# Altium footprint library 2020-09-26_17-27-19.PcbLib: 69 footprints (part 1 of 5)
Each footprint in its own frame and in the unit in brackets; x right, y up, seen from the top. Pads: shape width x height; smd on the part's side, far side on the other; paste and mask are expansions set on the pad; w line width, h text height; cw(c..) or ccw(c..) is an arc to the next point about the centre after c.
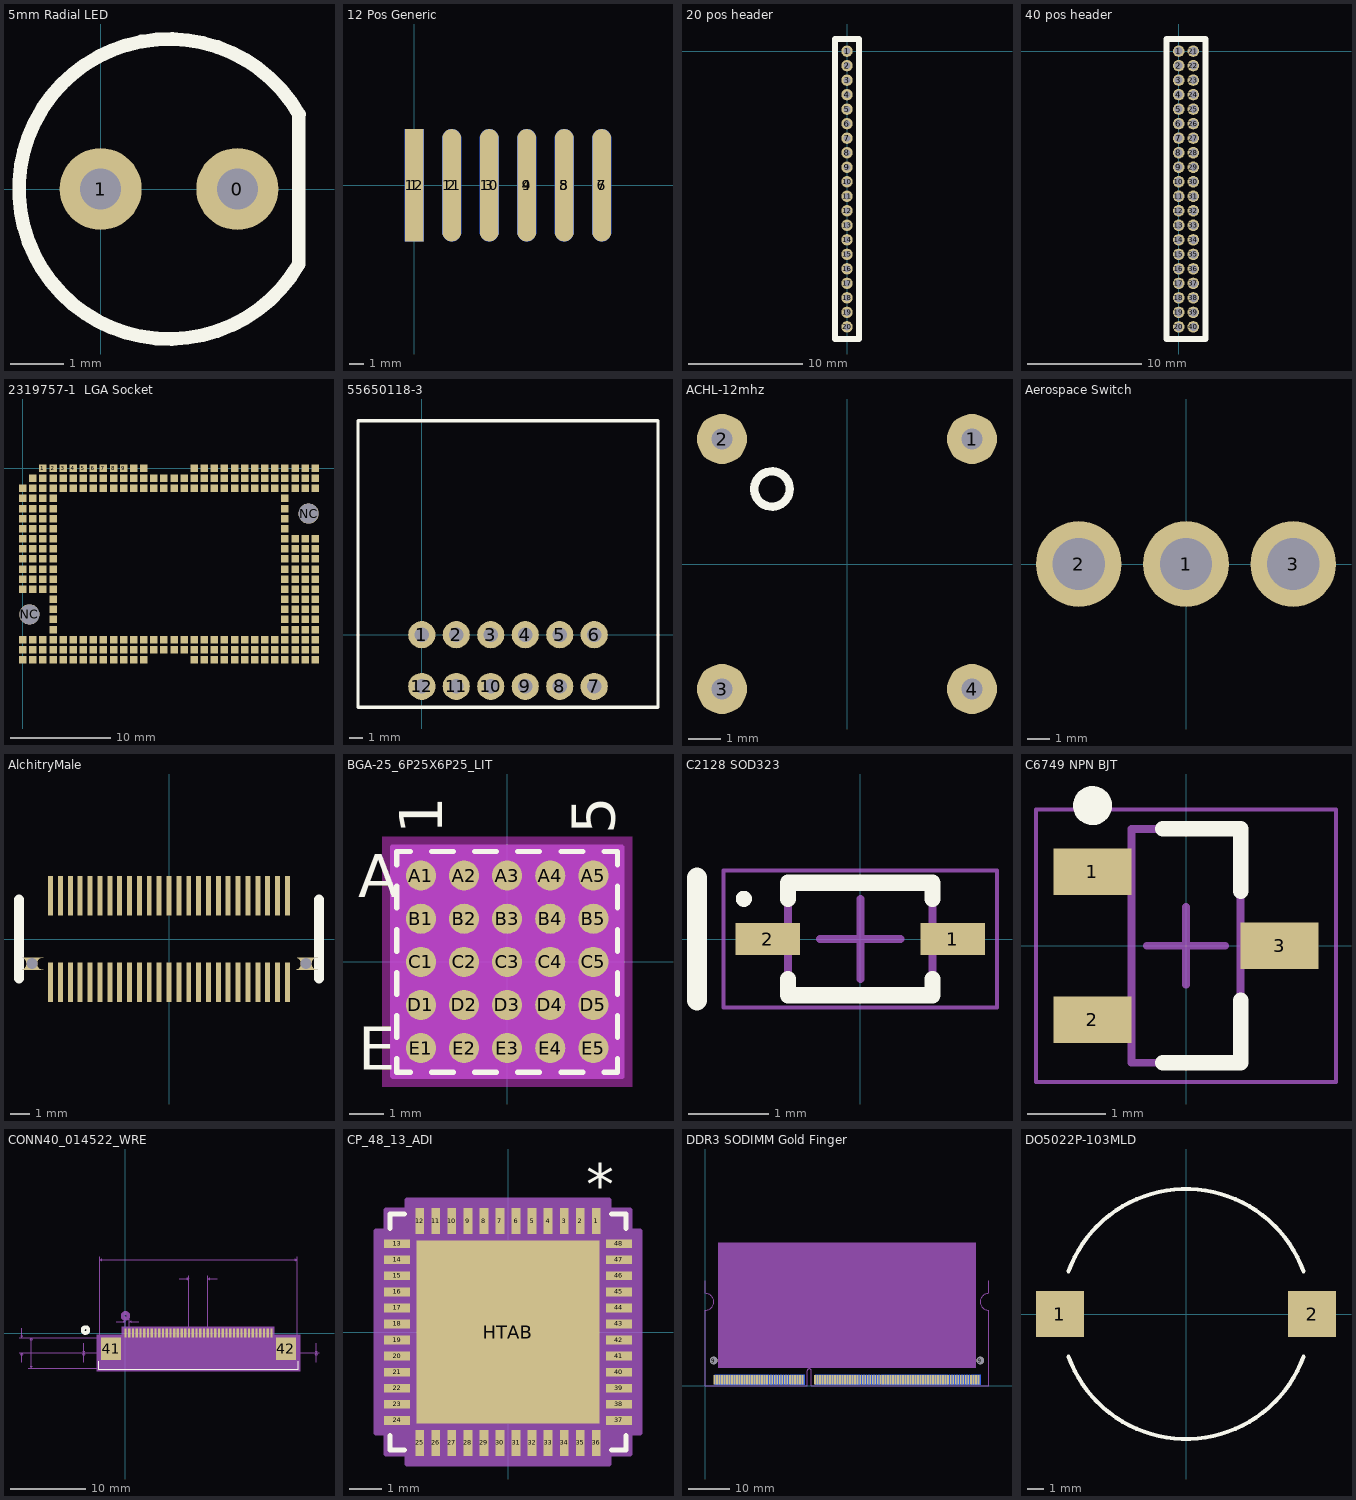
[diagram p0: the footprints below, top view; thin cyan lines are the x and y axes]

## 5mm Radial LED [mil]
pads (2):
  round 60 hole 30: 0(100,0) 1(0,0)
Top Overlay:
  lines w10: 145,55.12 145,-55 cw(c50,0) 145.12,54.8

## 12 Pos Generic [mm]
pads (12):
  rect 1.27x7.62 smd paste-10: 1(0,0)
  oval 1.27x7.62 smd paste-10: 2(2.54,0) 3(5.08,0) 4(7.62,0) 5(10.16,0) 6(12.7,0)
  oval 1.27x7.62 smd far side paste-10: 7(12.7,0) 8(10.16,0) 9(7.62,0) 10(5.08,0) 11(2.54,0)
  rect 1.27x7.62 smd far side paste-10: 12(0,0)
Top Solder:
  region: -2.54,3.937 15.24,3.937 15.24,-4.445 -2.54,-4.445
Bottom Solder:
  region: -2.54,3.937 15.24,3.937 15.24,-4.445 -2.54,-4.445

## 20 pos header [mm] "50mil pitch single row"
pads (20):
  round 1 hole 0.6: 1(0,0) 2(0,-1.27) 3(0,-2.54) 4(0,-3.81) 5(0,-5.08) 6(0,-6.35) 7(0,-7.62) 8(0,-8.89) 9(0,-10.16) 10(0,-11.43) 11(0,-12.7) 12(0,-13.97) 13(0,-15.24) 14(0,-16.51) 15(0,-17.78) 16(0,-19.05) 17(0,-20.32) 18(0,-21.59) 19(0,-22.86) 20(0,-24.13)
Top Overlay:
  lines w0.5: -1.05,-25.195 -1.05,1.065 1.05,1.065 1.05,-25.195 -1.05,-25.195
3D body "20pos header.STEP": height 3.3, standoff -3, extent -1.05,-24.75 1.05,0.65

## 40 pos header [mm]
pads (40):
  round 1 hole 0.7: 1(0,0) 2(0,-1.27) 3(0,-2.54) 4(0,-3.81) 5(0,-5.08) 6(0,-6.35) 7(0,-7.62) 8(0,-8.89) 9(0,-10.16) 10(0,-11.43) 11(0,-12.7) 12(0,-13.97) 13(0,-15.24) 14(0,-16.51) 15(0,-17.78) 16(0,-19.05) 17(0,-20.32) 18(0,-21.59) 19(0,-22.86) 20(0,-24.13) 21(1.27,0) 22(1.27,-1.27) 23(1.27,-2.54) 24(1.27,-3.81) 25(1.27,-5.08) 26(1.27,-6.35) 27(1.27,-7.62) 28(1.27,-8.89) 29(1.27,-10.16) 30(1.27,-11.43) 31(1.27,-12.7) 32(1.27,-13.97) 33(1.27,-15.24) 34(1.27,-16.51) 35(1.27,-17.78) 36(1.27,-19.05) 37(1.27,-20.32) 38(1.27,-21.59) 39(1.27,-22.86) 40(1.27,-24.13)
Top Overlay:
  lines w0.5: -1.065,-25.195 2.335,-25.195 2.335,1.065 -1.065,1.065 -1.065,-25.195
3D body "M50-3502042.STEP": height 3.5, standoff -2.8, extent -1.05,-24.75 2.35,0.65

## 2319757-1  LGA Socket [mm]
pads (259):
  rect 0.75x0.75 smd: 1(2,0) 2(3,0) 3(4,0) 4(5,0) 5(6,0) 6(7,0) 7(8,0) 8(9,0) 9(10,0) 10(11,0) 11(12,0) 12(17,0) 13(18,0) 14(19,0) 15(20,0) 16(21,0) 17(22,0) 18(23,0) 19(24,0) 20(25,0) 21(26,0) 22(27,0) 23(28,0) 24(29,0) 25(1,-1) 26(2,-1) 27(3,-1) 28(4,-1) 29(5,-1) 30(6,-1) 31(7,-1) 32(8,-1) 33(9,-1) 34(10,-1) 35(11,-1) 36(12,-1) 37(13,-1) 38(14,-1) 39(15,-1) 40(16,-1) 41(17,-1) 42(18,-1) 43(19,-1) 44(20,-1) 45(21,-1) 46(22,-1) 47(23,-1) 48(24,-1) 49(25,-1) 50(26,-1) 51(27,-1) 52(28,-1) 53(29,-1) 54(0,-2) 55(1,-2) 56(2,-2) 57(3,-2) 58(4,-2) 59(5,-2) 60(6,-2) 61(7,-2) 62(8,-2) 63(9,-2) 64(10,-2) 65(11,-2) 66(12,-2) 67(13,-2) 68(14,-2) 69(15,-2) 70(16,-2) 71(17,-2) 72(18,-2) 73(19,-2) 74(20,-2) 75(21,-2) 76(22,-2) 77(23,-2) 78(24,-2) 79(25,-2) 80(26,-2) 81(27,-2) 82(28,-2) 83(29,-2) 84(0,-3) 85(1,-3) 86(2,-3) 87(3,-3) 88(26,-3) 89(0,-4) 90(1,-4) 91(2,-4) 92(3,-4) 93(26,-4) 94(0,-5) 95(1,-5) 96(2,-5) 97(3,-5) 98(26,-5) 99(0,-6) 100(1,-6) 101(2,-6) 102(3,-6) 103(26,-6) 104(0,-7) 105(1,-7) 106(2,-7) 107(3,-7) 108(26,-7) 109(27,-7) 110(28,-7) 111(29,-7) 112(0,-8) 113(1,-8) 114(2,-8) 115(3,-8) 116(26,-8) 117(27,-8) 118(28,-8) 119(29,-8) 120(0,-9) 121(1,-9) 122(2,-9) 123(3,-9) 124(26,-9) 125(27,-9) 126(28,-9) 127(29,-9) 128(0,-10) 129(1,-10) 130(2,-10) 131(3,-10) 132(26,-10) 133(27,-10) 134(28,-10) 135(29,-10) 136(0,-11) 137(1,-11) 138(2,-11) 139(3,-11) 140(26,-11) 141(27,-11) 142(28,-11) 143(29,-11) 144(0,-12) 145(1,-12) 146(2,-12) 147(3,-12) 148(26,-12) 149(27,-12) 150(28,-12) 151(29,-12) 152(3,-13) 153(26,-13) 154(27,-13) 155(28,-13) 156(29,-13) 157(3,-14) 158(26,-14) 159(27,-14) 160(28,-14) 161(29,-14) 162(3,-15) 163(26,-15) 164(27,-15) 165(28,-15) 166(29,-15) 167(3,-16) 168(26,-16) 169(27,-16) 170(28,-16) 171(29,-16) 172(0,-17) 173(1,-17) 174(2,-17) 175(3,-17) 176(4,-17) 177(5,-17) 178(6,-17) 179(7,-17) 180(8,-17) 181(9,-17) 182(10,-17) 183(11,-17) 184(12,-17) 185(13,-17) 186(14,-17) 187(15,-17) 188(16,-17) 189(17,-17) 190(18,-17) 191(19,-17) 192(20,-17) 193(21,-17) 194(22,-17) 195(23,-17) 196(24,-17) 197(25,-17) 198(26,-17) 199(27,-17) 200(28,-17) 201(29,-17) 202(0,-18) 203(1,-18) 204(2,-18) 205(3,-18) 206(4,-18) 207(5,-18) 208(6,-18) 209(7,-18) 210(8,-18) 211(9,-18) 212(10,-18) 213(11,-18) 214(12,-18) 215(13,-18) 216(14,-18) 217(15,-18) 218(16,-18) 219(17,-18) 220(18,-18) 221(19,-18) 222(20,-18) 223(21,-18) 224(22,-18) 225(23,-18) 226(24,-18) 227(25,-18) 228(26,-18) 229(27,-18) 230(28,-18) 231(29,-18) 232(0,-19) 233(1,-19) 234(2,-19) 235(3,-19) 236(4,-19) 237(5,-19) 238(6,-19) 239(7,-19) 240(8,-19) 241(9,-19) 242(10,-19) 243(11,-19) 244(12,-19) 245(17,-19) 246(18,-19) 247(19,-19) 248(20,-19) 249(21,-19) 250(22,-19) 251(23,-19) 252(24,-19) 253(25,-19) 254(26,-19) 255(27,-19) 256(28,-19) 257(29,-19)
  round 2 hole 2 unplated: NC(0.65,-14.5) NC(28.35,-4.5)

## 55650118-3 [mm] "12 pos right angle board connector"
pads (12):
  round 2 hole 1.07: 1(0,0) 2(2.54,0) 3(5.08,0) 4(7.62,0) 5(10.16,0) 6(12.7,0) 7(12.7,-3.81) 8(10.16,-3.81) 9(7.62,-3.81) 10(5.08,-3.81) 11(2.54,-3.81) 12(0,-3.81)
Top Overlay:
  lines w0.254: -4.699,-5.334 17.399,-5.334 17.399,15.748 -4.699,15.748 -4.699,-5.334

## ACHL-12mhz [mil]
pads (4):
  round 60 hole 25: 1(150,150) 2(-150,150) 3(-150,-150) 4(150,-150)
Top Overlay:
  circle w10: c-90,90 r21.21
3D body "12Mhz Clock.STEP": height 194.88, standoff -147.64, extent -259.84,-259.84 259.84,259.84

## Aerospace Switch [mm]
pads (3):
  round 3.75 hole 2.3: 1(0,0) 2(-4.699,0) 3(4.699,0)

## AlchitryMale [mm]
height 4.4
pads (52):
  rect 0.25x2 smd: 1(-6,2.2) 2(-5.5,2.2) 3(-5,2.2) 4(-4.5,2.2) 5(-4,2.2) 6(-3.5,2.2) 7(-3,2.2) 8(-2.5,2.2) 9(-2,2.2) 10(-1.5,2.2) 11(-1,2.2) 12(-0.5,2.2) 13(0,2.2) 14(0.5,2.2) 15(1,2.2) 16(1.5,2.2) 17(2,2.2) 18(2.5,2.2) 19(3,2.2) 20(3.5,2.2) 21(4,2.2) 22(4.5,2.2) 23(5,2.2) 24(5.5,2.2) 25(6,2.2) 26(6,-2.2) 27(5.5,-2.2) 28(5,-2.2) 29(4.5,-2.2) 30(4,-2.2) 31(3.5,-2.2) 32(3,-2.2) 33(2.5,-2.2) 34(2,-2.2) 35(1.5,-2.2) 36(1,-2.2) 37(0.5,-2.2) 38(0,-2.2) 39(-0.5,-2.2) 40(-1,-2.2) 41(-1.5,-2.2) 42(-2,-2.2) 43(-2.5,-2.2) 44(-3,-2.2) 45(-3.5,-2.2) 46(-4,-2.2) 47(-4.5,-2.2) 48(-5,-2.2) 49(-5.5,-2.2) 50(-6,-2.2)
  oval 0.55x0 hole 0.55 unplated: 14(-6.95,-1.25) 14(6.95,-1.25)
Top Overlay:
  lines w0.5: -7.6,-2 -7.6,2 ; 7.6,-2 7.6,2
3D body "Alchitry Male Conn.STEP": height 4.4, standoff -0.6, extent -7.6,-2.7 7.6,2.7

## BGA-25_6P25X6P25_LIT [mil]
pads (25):
  round 35 smd paste+0 mask+0: A1(-100,100) A2(-50,100) A3(0,100) A4(50,100) A5(100,100) B1(-100,50) B2(-50,50) B3(0,50) B4(50,50) B5(100,50) C1(-100,0) C2(-50,0) C3(0,0) C4(50,0) C5(100,0) D1(-100,-50) D2(-50,-50) D3(0,-50) D4(50,-50) D5(100,-50) E1(-100,-100) E2(-50,-100) E3(0,-100) E4(50,-100) E5(100,-100)
Top Overlay:
  lines w6: -128,-112.34 -128,-128 -112.34,-128 ; -128,-87.66 -128,-62.34 ; -128,-37.66 -128,-12.34 ; -128,12.34 -128,37.66 ; -128,62.34 -128,87.66 ; -128,112.34 -128,128 -112.34,128 ; -87.66,-128 -62.34,-128 ; -87.66,128 -62.34,128 ; -37.66,-128 -12.34,-128 ; -37.66,128 -12.34,128 ; 12.34,-128 37.66,-128 ; 12.34,128 37.66,128 ; 62.34,-128 87.66,-128 ; 62.34,128 87.66,128 ; 112.34,-128 128,-128 128,-112.34 ; 112.34,128 128,128 128,112.34 ; 128,-87.66 128,-62.34 ; 128,-37.66 128,-12.34 ; 128,12.34 128,37.66 ; 128,62.34 128,87.66
  text "A" at -173,75 h50
  text "E" at -173,-125 h50
  text "1" at -75,148 h50
  text "5" at 125,148 h50
Bottom Overlay:
  text "A" at -148,75 h50
  text "E" at -148,-125 h50
  text "1" at -125,148 h50
  text "5" at 75,148 h50
Keep-Out Layer:
  region: -145,-145 -145,145 145,145 145,-145
Mechanical 13:
  lines w1: -123,98 -98,123 ; -123,-123 123,-123 123,123 -123,123 -123,-123
  text "A" at -173,75 h50
  text "E" at -173,-125 h50
  text "1" at -75,148 h50
  text "5" at 125,148 h50
Mechanical 15:
  region: 133,-133 -133,-133 -133,133 133,133
  lines w6: -133,-133 -133,133 133,133 133,-133 -133,-133
3D body "BGA-25_6P25X6P25_LIT.step": height 205.12, standoff -0.02, extent -122.99,-122.99 122.99,122.99

## C2128 SOD323 [mm] "SODFL, 2-Leads, Body 1.30x2.50mm, IPC Medium Density"
height 1.1
pads (2):
  rect 0.8x0.4 smd: 1(1.15,0) 2(-1.15,0)
Top Overlay:
  circle w0.1: c-1.45,0.5 r0.05
  lines w0.2: -0.9,-0.5 -0.9,-0.7 0.9,-0.7 0.9,-0.5 ; -0.9,0.5 -0.9,0.7 0.9,0.7 0.9,0.5
  lines w0.254: -2.032,-0.762 -2.032,0.762
Mechanical 13:
  lines w0.1: -0.9,-0.7 -0.9,0.7 0.9,0.7 0.9,-0.7 -0.9,-0.7
Mechanical 15:
  lines w0.05: -1.7,-0.85 -1.7,0.85 1.7,0.85 1.7,-0.85 -1.7,-0.85
  lines w0.1: -0.5,0 0.5,0 ; 0,-0.5 0,0.5
3D body: height 1.1, standoff 0, extent -0.9,-0.7 0.9,0.7

## C6749 NPN BJT [mm] "SOT23, 3-Leads, Body 2.90x2.45mm, Pitch 0.95mm, IPC Medium Density"
height 1.1
pads (3):
  rect 1x0.6 smd: 1(-1.2,0.95) 2(-1.2,-0.95) 3(1.2,0)
Top Overlay:
  circle w0.25: c-1.2,1.8 r0.125
  lines w0.2: -0.3,-1.5 0.7,-1.5 0.7,-0.7 ; -0.3,1.5 0.7,1.5 0.7,0.7
Mechanical 13:
  lines w0.1: -0.7,-1.5 0.7,-1.5 0.7,1.5 -0.7,1.5 -0.7,-1.5
Mechanical 15:
  lines w0.05: -1.925,-1.75 1.925,-1.75 1.925,1.75 -1.925,1.75 -1.925,-1.75
  lines w0.1: -0.5,0 0.5,0 ; 0,-0.5 0,0.5
3D body: height 1.1, standoff 0.05, extent -0.7,-1.5 0.7,1.5

## CONN40_014522_WRE [mil]
pads (42):
  rect 12x47 smd paste+0 mask+0: 1(0,0) 2(19.69,0) 3(39.38,0) 4(59.07,0) 5(78.76,0) 6(98.45,0) 7(118.14,0) 8(137.83,0) 9(157.52,0) 10(177.21,0) 11(196.9,0) 12(216.59,0) 13(236.28,0) 14(255.97,0) 15(275.66,0) 16(295.35,0) 17(315.04,0) 18(334.73,0) 19(354.42,0) 20(374.11,0) 21(393.8,0) 22(413.49,0) 23(433.18,0) 24(452.87,0) 25(472.56,0) 26(492.25,0) 27(511.94,0) 28(531.63,0) 29(551.32,0) 30(571.01,0) 31(590.7,0) 32(610.39,0) 33(630.08,0) 34(649.77,0) 35(669.46,0) 36(689.15,0) 37(708.84,0) 38(728.53,0) 39(748.22,0) 40(767.91,0)
  rect 106x118 smd: 41(-76.12,-82.5) 42(844.03,-82.5)
Top Overlay:
  circle w20: c-210.54,16.5 r15
  lines w6: -140.54,-147.92 -140.54,-189.5 908.46,-189.5 908.46,-147.92
Bottom Overlay:
  circle w20: c-210,16 r15
Mechanical 5:
  region: -150.54,-8.5 918.46,-8.5 918.46,-199.5 -150.54,-199.5
Mechanical 7:
  lines w1: -560.54,-104 383.95,-104 -235.54,-104 433.95,-104 433.95,301.5 ; -560.54,-23.5 -135.54,-23.5 ; -545.54,-154 -545.54,-104 ; -545.54,26.5 -545.54,-23.5 ; -510.55,-184.5 -135.54,-184.5 ; -510.55,-23.5 -135.54,-23.5 ; -220.54,-154 -220.54,-104 ; -220.54,-54 -220.54,-104 ; -135.54,401.5 -135.54,-23.5 ; -50,61.5 0,61.5 ; 0,76.5 0,-104 ; 19.69,-104 19.69,76.5 ; 69.69,61.5 19.69,61.5 ; 283.95,286.5 333.95,286.5 ; 333.95,-104 333.95,301.5 ; 483.95,286.5 433.95,286.5 ; 903.46,-23.5 903.46,401.5 ; 1003.46,-154 1003.46,-104 ; 1003.46,-54 1003.46,-104 ; -545.54,-104 -540.54,-114 -550.54,-114 -545.54,-104 ; -545.54,-23.5 -540.54,-13.5 -550.54,-13.5 -545.54,-23.5 ; -495.55,-184.5 -490.55,-174.5 -500.55,-174.5 -495.55,-184.5 ; -495.55,-184.5 -495.55,-23.5 ; -495.55,-23.5 -490.55,-33.5 -500.55,-33.5 -495.55,-23.5 ; -220.54,-104 -215.54,-114 -225.54,-114 -220.54,-104 ; -220.54,-104 -215.54,-94 -225.54,-94 -220.54,-104 ; -135.54,386.5 -125.55,381.5 -125.55,391.5 -135.54,386.5 ; -135.54,386.5 903.46,386.5 ; 0,-104 1018.46,-104 0,-104 ; 0,61.5 -10,56.5 -10,66.5 0,61.5 ; 19.69,61.5 29.69,56.5 29.69,66.5 19.69,61.5 ; 333.95,286.5 323.95,281.5 323.95,291.5 333.95,286.5 ; 433.95,286.5 443.95,281.5 443.95,291.5 433.95,286.5 ; 903.46,386.5 893.46,381.5 893.46,391.5 903.46,386.5 ; 1003.46,-104 1008.46,-114 998.46,-114 1003.46,-104 ; 1003.46,-104 1008.46,-94 998.46,-94 1003.46,-104
  text "0.161in/4.089mm" at -703.04,-116.5 h25
  text "0.08in/2.045mm" at -740.54,-76.25 h25
  text "0in/0mm" at -328.05,-116.5 h25
  text "0in/0mm" at 1023.46,-116.5 h25
  text "1.039in/26.391mm" at 283.95,406.5 h25
  text "0.1in/2.54mm" at 308.95,306.5 h25
  text "0.02in/0.5mm" at 107.13,81.5 h25
  text "Alt Padstyle 2: OX90Y60D30P" at 46.45,-869.5 h50
  text "Alt Padstyle 1: OX60Y90D30P" at 46.45,-794.5 h50
  text "Right Mtg Padstyle: EX60Y60D30P" at -3.54,-719.5 h50
  text "Left Mtg Padstyle: EX60Y60D30P" at 8.96,-644.5 h50
  text "3rd Mtg Padstyle: EX70Y70D70P" at 21.45,-569.5 h50
  text "2nd Mtg Padstyle: EX70Y70D70P" at 21.45,-494.5 h50
  text "1st Mtg Padstyle: RX118Y106D0T" at 8.96,-419.5 h50
  text "Default Padstyle: RX12Y47D0T" at 33.95,-344.5 h50
Mechanical 13:
  circle w20: c0,91.5 r15
  lines w1: -135.54,-184.5 -135.54,-23.5 903.46,-23.5 903.46,-184.5 -135.54,-184.5
Mechanical 15:
  region: 783.91,-13.5 783.91,33.5 -16,33.5 -16,-13.5 -145.54,-13.5 -145.54,-194.5 913.46,-194.5 913.46,-13.5
  lines w6: -145.54,-194.5 913.46,-194.5 913.46,-13.5 783.91,-13.5 783.91,33.5 -16,33.5 -16,-13.5 -145.54,-13.5 -145.54,-194.5
3D body: height 10, standoff 0, extent 0,0 10,10

## CP_48_13_ADI [mm]
pads (49):
  rect 0.275x0.805 smd paste+0 mask+0: 1(2.75,3.452) 2(2.25,3.452) 3(1.75,3.452) 4(1.25,3.452) 5(0.75,3.452) 6(0.25,3.452) 7(-0.25,3.452) 8(-0.75,3.452) 9(-1.25,3.452) 10(-1.75,3.452) 11(-2.25,3.452) 12(-2.75,3.452) 25(-2.75,-3.452) 26(-2.25,-3.452) 27(-1.75,-3.452) 28(-1.25,-3.452) 29(-0.75,-3.452) 30(-0.25,-3.452) 31(0.25,-3.452) 32(0.75,-3.452) 33(1.25,-3.452) 34(1.75,-3.452) 35(2.25,-3.452) 36(2.75,-3.452)
  rect 0.805x0.275 smd paste+0 mask+0: 13(-3.452,2.75) 14(-3.452,2.25) 15(-3.452,1.75) 16(-3.452,1.25) 17(-3.452,0.75) 18(-3.452,0.25) 19(-3.452,-0.25) 20(-3.452,-0.75) 21(-3.452,-1.25) 22(-3.452,-1.75) 23(-3.452,-2.25) 24(-3.452,-2.75) 37(3.452,-2.75) 38(3.452,-2.25) 39(3.452,-1.75) 40(3.452,-1.25) 41(3.452,-0.75) 42(3.452,-0.25) 43(3.452,0.25) 44(3.452,0.75) 45(3.452,1.25) 46(3.452,1.75) 47(3.452,2.25) 48(3.452,2.75)
  rect 5.7x5.7 smd paste+0 mask+0: HTAB(0,0)
Top Overlay:
  lines w0.152: -3.677,-3.22 -3.677,-3.677 -3.22,-3.677 ; -3.677,3.22 -3.677,3.677 -3.22,3.677 ; 3.22,-3.677 3.677,-3.677 3.677,-3.22 ; 3.22,3.677 3.677,3.677 3.677,3.22
  text "*" at 2.432,3.96 h1.27
Top Paste:
  region: -1.525,2.75 -2.75,2.75 -2.75,1.525 -1.525,1.525
  region: -1.525,1.325 -2.75,1.325 -2.75,0.1 -1.525,0.1
  region: -1.525,-0.1 -2.75,-0.1 -2.75,-1.325 -1.525,-1.325
  region: -1.525,-1.525 -2.75,-1.525 -2.75,-2.75 -1.525,-2.75
  region: -0.1,2.75 -1.325,2.75 -1.325,1.525 -0.1,1.525
  region: -0.1,1.325 -1.325,1.325 -1.325,0.1 -0.1,0.1
  region: -0.1,-0.1 -1.325,-0.1 -1.325,-1.325 -0.1,-1.325
  region: -0.1,-1.525 -1.325,-1.525 -1.325,-2.75 -0.1,-2.75
  region: 1.325,2.75 0.1,2.75 0.1,1.525 1.325,1.525
  region: 1.325,1.325 0.1,1.325 0.1,0.1 1.325,0.1
  region: 1.325,-0.1 0.1,-0.1 0.1,-1.325 1.325,-1.325
  region: 1.325,-1.525 0.1,-1.525 0.1,-2.75 1.325,-2.75
  region: 2.75,2.75 1.525,2.75 1.525,1.525 2.75,1.525
  region: 2.75,1.325 1.525,1.325 1.525,0.1 2.75,0.1
  region: 2.75,-0.1 1.525,-0.1 1.525,-1.325 2.75,-1.325
  region: 2.75,-1.525 1.525,-1.525 1.525,-2.75 2.75,-2.75
Mechanical 13:
  lines w0.025: -3.55,-3.55 3.55,-3.55 3.55,3.55 -3.55,3.55 -3.55,-3.55 ; -3.55,-2.9 -3.55,-2.6 -3.55,-2.9 ; -3.55,-2.4 -3.55,-2.1 -3.55,-2.4 ; -3.55,-1.9 -3.55,-1.6 -3.55,-1.9 ; -3.55,-1.4 -3.55,-1.1 -3.55,-1.4 ; -3.55,-0.9 -3.55,-0.6 -3.55,-0.9 ; -3.55,-0.4 -3.55,-0.1 -3.55,-0.4 ; -3.55,0.1 -3.55,0.4 -3.55,0.1 ; -3.55,0.6 -3.55,0.9 -3.55,0.6 ; -3.55,1.1 -3.55,1.4 -3.55,1.1 ; -3.55,1.6 -3.55,1.9 -3.55,1.6 ; -3.55,2.1 -3.55,2.4 -3.55,2.1 ; -3.55,2.6 -3.55,2.9 -3.55,2.6 ; -2.9,-3.55 -2.6,-3.55 -2.9,-3.55 ; -2.9,3.55 -2.6,3.55 -2.9,3.55 ; -2.4,-3.55 -2.1,-3.55 -2.4,-3.55 ; -2.4,3.55 -2.1,3.55 -2.4,3.55 ; -1.9,-3.55 -1.6,-3.55 -1.9,-3.55 ; -1.9,3.55 -1.6,3.55 -1.9,3.55 ; -1.4,-3.55 -1.1,-3.55 -1.4,-3.55 ; -1.4,3.55 -1.1,3.55 -1.4,3.55 ; -0.9,-3.55 -0.6,-3.55 -0.9,-3.55 ; -0.9,3.55 -0.6,3.55 -0.9,3.55 ; -0.4,-3.55 -0.1,-3.55 -0.4,-3.55 ; -0.4,3.55 -0.1,3.55 -0.4,3.55 ; 0.1,-3.55 0.4,-3.55 0.1,-3.55 ; 0.1,3.55 0.4,3.55 0.1,3.55 ; 0.6,-3.55 0.9,-3.55 0.6,-3.55 ; 0.6,3.55 0.9,3.55 0.6,3.55 ; 1.1,-3.55 1.4,-3.55 1.1,-3.55 ; 1.1,3.55 1.4,3.55 1.1,3.55 ; 1.6,-3.55 1.9,-3.55 1.6,-3.55 ; 1.6,3.55 1.9,3.55 1.6,3.55 ; 2.1,-3.55 2.4,-3.55 2.1,-3.55 ; 2.1,3.55 2.4,3.55 2.1,3.55 ; 2.6,-3.55 2.9,-3.55 2.6,-3.55 ; 2.6,3.55 2.9,3.55 2.6,3.55 ; 3.55,-2.9 3.55,-2.6 3.55,-2.9 ; 3.55,-2.4 3.55,-2.1 3.55,-2.4 ; 3.55,-1.9 3.55,-1.6 3.55,-1.9 ; 3.55,-1.4 3.55,-1.1 3.55,-1.4 ; 3.55,-0.9 3.55,-0.6 3.55,-0.9 ; 3.55,-0.4 3.55,-0.1 3.55,-0.4 ; 3.55,0.1 3.55,0.4 3.55,0.1 ; 3.55,0.6 3.55,0.9 3.55,0.6 ; 3.55,1.1 3.55,1.4 3.55,1.1 ; 3.55,1.6 3.55,1.9 3.55,1.6 ; 3.55,2.1 3.55,2.4 3.55,2.1 ; 3.55,2.6 3.55,2.9 3.55,2.6
  text "*" at 2.591,2.983 h0.64
Mechanical 15:
  region: -3.141,-3.804 -3.804,-3.804 -3.804,-3.141 -4.109,-3.141 -4.109,3.141 -3.804,3.141 -3.804,3.804 -3.141,3.804 -3.141,4.109 3.141,4.109 3.141,3.804 3.804,3.804 3.804,3.141 4.109,3.141 4.109,-3.141 3.804,-3.141 3.804,-3.804 3.141,-3.804 3.141,-4.109 -3.141,-4.109
  lines w0.152: -4.109,-3.141 -3.804,-3.141 -3.804,-3.804 -3.141,-3.804 -3.141,-4.109 3.141,-4.109 3.141,-3.804 3.804,-3.804 3.804,-3.141 4.109,-3.141 4.109,3.141 3.804,3.141 3.804,3.804 3.141,3.804 3.141,4.109 -3.141,4.109 -3.141,3.804 -3.804,3.804 -3.804,3.141 -4.109,3.141 -4.109,-3.141
3D body "CP_48_13_ADI.step": height 0.8, standoff 0, extent -3.55,-3.55 3.55,3.55

## DDR3 SODIMM Gold Finger [mm]
pads (206):
  rect 0.45x2.3 smd mask+0: 1(2.15,1.4) 3(2.75,1.4) 5(3.35,1.4) 7(3.95,1.4) 9(4.55,1.4) 11(5.15,1.4) 13(5.75,1.4) 15(6.35,1.4) 17(6.95,1.4) 19(7.55,1.4) 21(8.15,1.4) 23(8.75,1.4) 25(9.35,1.4) 27(9.95,1.4) 29(10.55,1.4) 31(11.15,1.4) 33(11.75,1.4) 35(12.35,1.4) 37(12.95,1.4) 39(13.55,1.4) 41(14.15,1.4) 43(14.75,1.4) 45(15.35,1.4) 47(15.95,1.4) 49(16.55,1.4) 51(17.15,1.4) 53(17.75,1.4) 55(18.35,1.4) 57(18.95,1.4) 59(19.55,1.4) 61(20.15,1.4) 63(20.75,1.4) 65(21.35,1.4) 67(21.95,1.4) 69(22.55,1.4) 71(23.15,1.4) 73(26.15,1.4) 75(26.75,1.4) 77(27.35,1.4) 79(27.95,1.4) 81(28.55,1.4) 83(29.15,1.4) 85(29.75,1.4) 87(30.35,1.4) 89(30.95,1.4) 91(31.55,1.4) 93(32.15,1.4) 95(32.75,1.4) 97(33.35,1.4) 99(33.95,1.4) 101(34.55,1.4) 103(35.15,1.4) 105(35.75,1.4) 107(36.35,1.4) 109(36.95,1.4) 111(37.55,1.4) 113(38.15,1.4) 115(38.75,1.4) 117(39.35,1.4) 119(39.95,1.4) 121(40.55,1.4) 123(41.15,1.4) 125(41.75,1.4) 127(42.35,1.4) 129(42.95,1.4) 131(43.55,1.4) 133(44.15,1.4) 135(44.75,1.4) 137(45.35,1.4) 139(45.95,1.4) 141(46.55,1.4) 143(47.15,1.4) 145(47.75,1.4) 147(48.35,1.4) 149(48.95,1.4) 151(49.55,1.4) 153(50.15,1.4) 155(50.75,1.4) 157(51.35,1.4) 159(51.95,1.4) 161(52.55,1.4) 163(53.15,1.4) 165(53.75,1.4) 167(54.35,1.4) 169(54.95,1.4) 171(55.55,1.4) 173(56.15,1.4) 175(56.75,1.4) 177(57.35,1.4) 179(57.95,1.4) 181(58.55,1.4) 183(59.15,1.4) 185(59.75,1.4) 187(60.35,1.4) 189(60.95,1.4) 191(61.55,1.4) 193(62.15,1.4) 195(62.75,1.4) 197(63.35,1.4) 199(63.95,1.4) 201(64.55,1.4) 203(65.15,1.4)
  rect 0.45x2.3 smd far side mask+0: 2(2.45,1.4) 4(3.05,1.4) 6(3.65,1.4) 8(4.25,1.4) 10(4.85,1.4) 12(5.45,1.4) 14(6.05,1.4) 16(6.65,1.4) 18(7.25,1.4) 20(7.85,1.4) 22(8.45,1.4) 24(9.05,1.4) 26(9.65,1.4) 28(10.25,1.4) 30(10.85,1.4) 32(11.45,1.4) 34(12.05,1.4) 36(12.65,1.4) 38(13.25,1.4) 40(13.85,1.4) 42(14.45,1.4) 44(15.05,1.4) 46(15.65,1.4) 48(16.25,1.4) 50(16.85,1.4) 52(17.45,1.4) 54(18.05,1.4) 56(18.65,1.4) 58(19.25,1.4) 60(19.85,1.4) 62(20.45,1.4) 64(21.05,1.4) 66(21.65,1.4) 68(22.25,1.4) 70(22.85,1.4) 72(23.45,1.4) 74(26.45,1.4) 76(27.05,1.4) 78(27.65,1.4) 80(28.25,1.4) 82(28.85,1.4) 84(29.45,1.4) 86(30.05,1.4) 88(30.65,1.4) 90(31.25,1.4) 92(31.85,1.4) 94(32.45,1.4) 96(33.05,1.4) 98(33.65,1.4) 100(34.25,1.4) 102(34.85,1.4) 104(35.45,1.4) 106(36.05,1.4) 108(36.65,1.4) 110(37.25,1.4) 112(37.85,1.4) 114(38.45,1.4) 116(39.05,1.4) 118(39.65,1.4) 120(40.25,1.4) 122(40.85,1.4) 124(41.45,1.4) 126(42.05,1.4) 128(42.65,1.4) 130(43.25,1.4) 132(43.85,1.4) 134(44.45,1.4) 136(45.05,1.4) 138(45.65,1.4) 140(46.25,1.4) 142(46.85,1.4) 144(47.45,1.4) 146(48.05,1.4) 148(48.65,1.4) 150(49.25,1.4) 152(49.85,1.4) 154(50.45,1.4) 156(51.05,1.4) 158(51.65,1.4) 160(52.25,1.4) 162(52.85,1.4) 164(53.45,1.4) 166(54.05,1.4) 168(54.65,1.4) 170(55.25,1.4) 172(55.85,1.4) 174(56.45,1.4) 176(57.05,1.4) 178(57.65,1.4) 180(58.25,1.4) 182(58.85,1.4) 184(59.45,1.4) 186(60.05,1.4) 188(60.65,1.4) 190(61.25,1.4) 192(61.85,1.4) 194(62.45,1.4) 196(63.05,1.4) 198(63.65,1.4) 200(64.25,1.4) 202(64.85,1.4) 204(65.45,1.4)
  round 1.8 hole 1.8: 9(2,6) 9(65.6,6)
Top Solder:
  rectangle: 25.925,0 65.375,2.55
  rectangle: 1.925,0 23.375,2.55
Bottom Solder:
  rectangle: 2.225,0 23.675,2.55
  rectangle: 26.225,0 65.675,2.55
Mechanical 5:
  rectangle: 3,4.2 64.6,34.2
Mechanical 7:
  lines w0.075: 0,25 0,22 cw(c0,20) 0,18 0,0 24.3,0 24.3,3.5 cw(c24.8,3.5) 25.3,3.5 25.3,0 67.6,0 67.6,18 cw(c67.6,20) 67.6,22 67.6,25

## DO5022P-103MLD [mm] "10uH"
pads (2):
  rect 2.92x2.79 smd: 1(-7.685,0) 2(7.685,0)
Top Overlay:
  lines w0.254: -7.16,-2.606 ccw(c0,0) 7.16,-2.606 ; -7.16,2.606 cw(c0,0) 7.16,2.606